# Altium footprint library IC.PcbLib: 108 footprints (part 2 of 8)
Each footprint in its own frame and in the unit in brackets; x right, y up, seen from the top. Pads: shape width x height; smd on the part's side, far side on the other; paste and mask are expansions set on the pad; w line width, h text height; cw(c..) or ccw(c..) is an arc to the next point about the centre after c.
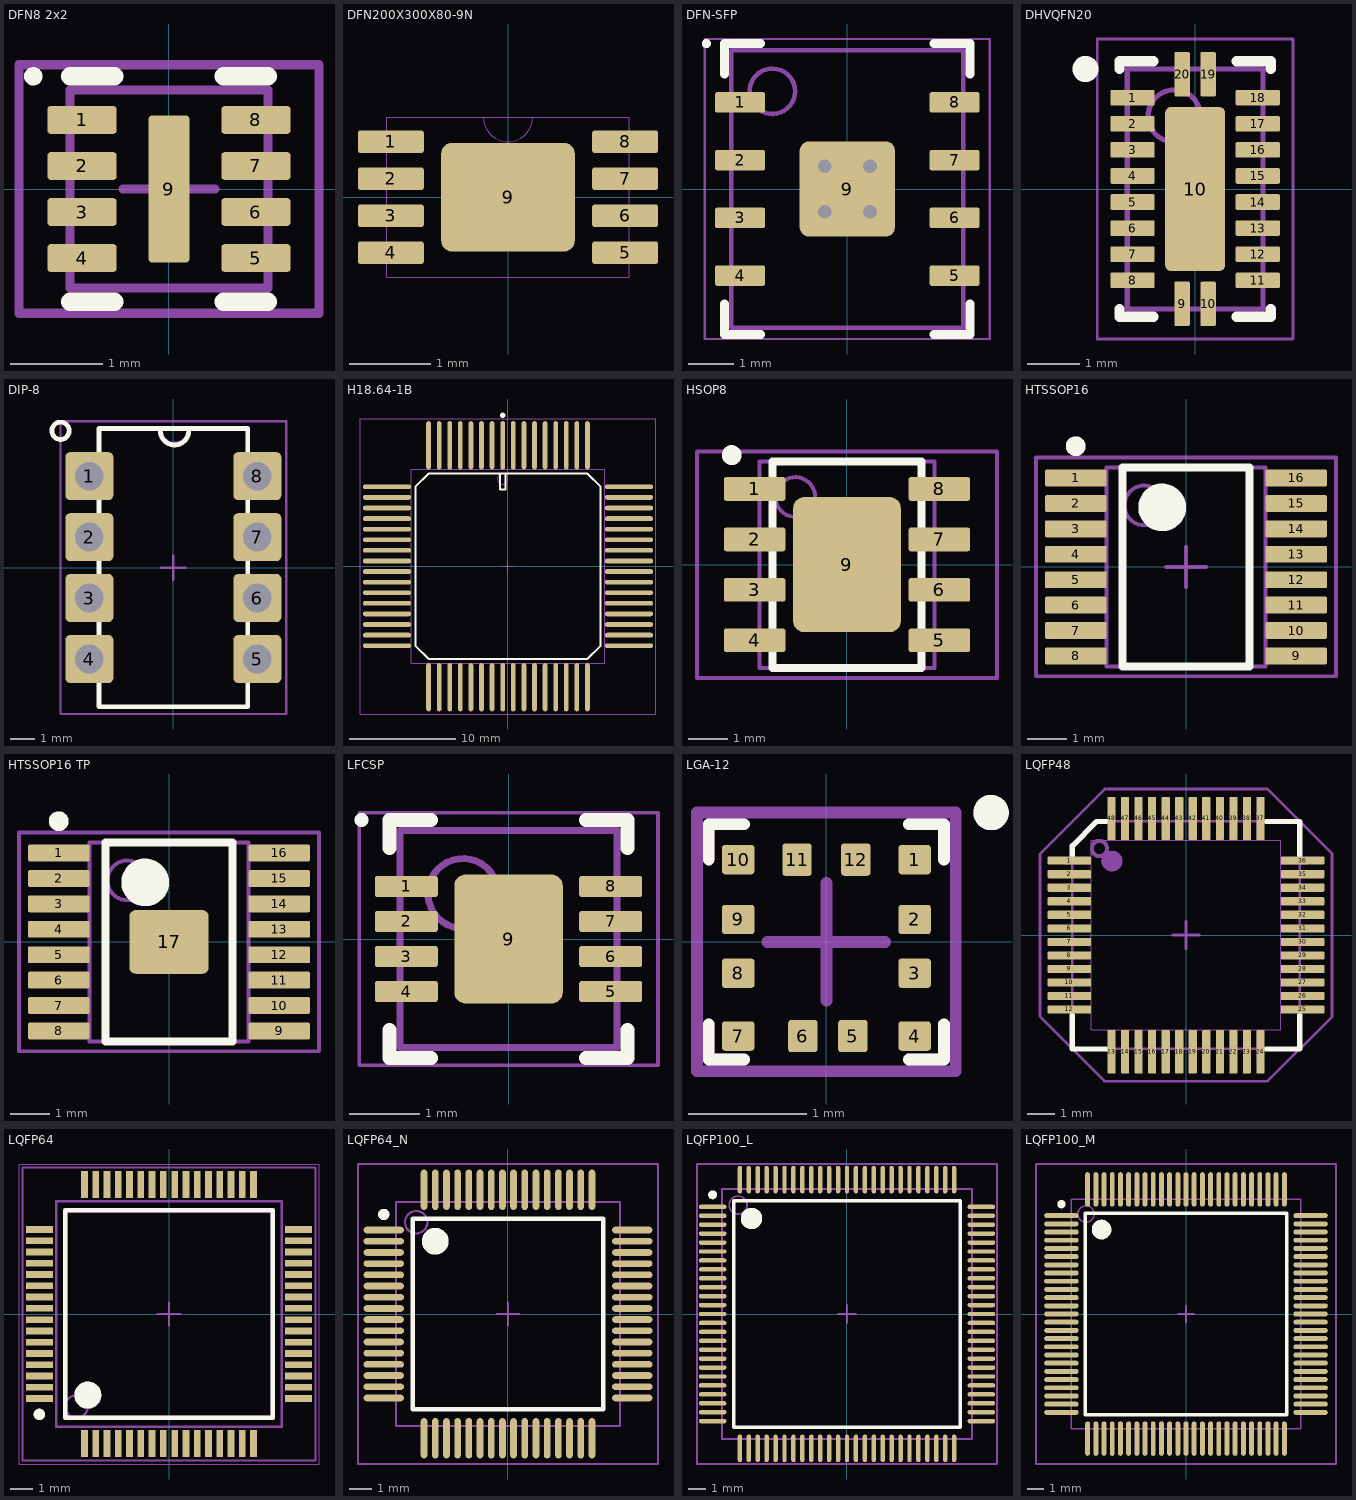
[diagram p1: the footprints below, top view; thin cyan lines are the x and y axes]

## DFN8 2x2 [mm] "LM193QT, SON, 8-Leads, Body 2,00x2,00mm, Pitch 0,50mm, Thermal Pad 1,58x0,59mm, IPC Medium Density"
height 0.6
pads (9):
  rrect20% 0.75x0.3 smd: 1(-0.945,0.75) 2(-0.945,0.25) 3(-0.945,-0.25) 4(-0.945,-0.75) 5(0.945,-0.75) 6(0.945,-0.25) 7(0.945,0.25) 8(0.945,0.75)
  rrect20% 0.45x1.6 smd paste-0.295: 9(0,0)
Top Overlay:
  circle w0.1: c-1.475,1.225 r0.05
  lines w0.2: -1.075,-1.225 -0.595,-1.225 ; -1.075,1.225 -0.595,1.225 ; 0.595,-1.225 1.075,-1.225 ; 0.595,1.225 1.075,1.225
Top Paste:
  rectangle: 0.1,-1.4 1.4,-0.1
  rectangle: 0.1,0.1 1.4,1.4
  rectangle: -1.4,-1.4 -0.1,-0.1
  rectangle: -1.4,0.1 -0.1,1.4
M3_comm_top:
  text ".comment" at -1.35,-0.225 h1
M5_asm_top:
  lines w0.1: -1.075,-1.075 1.075,-1.075 1.075,1.075 -1.075,1.075 -1.075,-1.075
  text ".Designator" at -1.475,1.25 h1
M7_courtyard_top:
  lines w0.1: -0.5,0 0.5,0 ; 0,-0.5 0,0.5 ; -1.63,-1.35 1.63,-1.35 1.63,1.35 -1.63,1.35 -1.63,-1.35
3D body "DFN8 2x2.step": height 0.6, standoff 0, extent -1.125,-1.075 1.125,1.075

## DFN200X300X80-9N [mil]
pads (9):
  rrect20% 32x11 smd: 1(-57,27) 2(-57,9) 3(-57,-9) 4(-57,-27) 5(57,-27) 6(57,-9) 7(57,9) 8(57,27)
  rrect20% 65x53 smd: 9(0,0)
M1_3D_TOP:
  lines w0: -12,39 ccw(c0,39) 12,39 ; -12,39 12,39 ; -12,39 -59,39 -59,-39 59,-39 59,39 12,39
3D body "User Library-DFN-8-1.step": height 31.1, standoff -0.39, extent -61.02,-39.36 61.03,39.38

## DFN-SFP [mm] "DFN Small Flag Package"
height 0.9
pads (9):
  rrect20% 1.1x0.45 smd: 1(-2.36,1.905) 2(-2.36,0.635) 3(-2.36,-0.635) 4(-2.36,-1.905) 5(2.36,-1.905) 6(2.36,-0.635) 7(2.36,0.635) 8(2.36,1.905)
  rrect20% 2.1x2.1 smd: 9(0,0)
via -0.5,0.5 diameter 0.7 hole 0.3
via 0.5,0.5 diameter 0.7 hole 0.3
via -0.5,-0.5 diameter 0.7 hole 0.3
via 0.5,-0.5 diameter 0.7 hole 0.3
Top Overlay:
  circle w0.1: c-3.1,3.2 r0.05
  lines w0.2: -2.7,-2.53 -2.7,-3.2 -1.91,-3.2 ; -2.7,2.53 -2.7,3.2 -1.91,3.2 ; 1.91,-3.2 2.7,-3.2 2.7,-2.53 ; 1.91,3.2 2.7,3.2 2.7,2.53
Mechanical 13:
  circle w0.1: c-1.65,2.15 r0.5
  lines w0.1: -2.55,-3.05 -2.55,3.05 2.55,3.05 2.55,-3.05 -2.55,-3.05
Mechanical 15:
  lines w0.05: -3.135,-3.3 -3.135,3.3 3.135,3.3 3.135,-3.3 -3.135,-3.3
  lines w0.1: -0.5,0 0.5,0 ; 0,-0.5 0,0.5
3D body "DFN-SFP.step": height 0.9, standoff 0, extent -2.551,-3.05 2.551,3.05

## DHVQFN20 [mm] "SOT764-1, QFN, 20-Leads, Body 2.60x4.60mm, Pitch 0.50mm, Thermal Pad 1.15x3.15mm, IPC Medium Density"
height 1
pads (21):
  rrect20% 0.85x0.3 smd: 1(-1.2,1.75) 2(-1.2,1.25) 3(-1.2,0.75) 4(-1.2,0.25) 5(-1.2,-0.25) 6(-1.2,-0.75) 7(-1.2,-1.25) 8(-1.2,-1.75) 11(1.2,-1.75) 12(1.2,-1.25) 13(1.2,-0.75) 14(1.2,-0.25) 15(1.2,0.25) 16(1.2,0.75) 17(1.2,1.25) 18(1.2,1.75)
  rrect20% 0.3x0.85 smd: 9(-0.25,-2.2) 10(0.25,-2.2) 19(0.25,2.2) 20(-0.25,2.2)
  rrect20% 1.15x3.15 smd: 10(0,0)
Top Overlay:
  circle w0.25: c-2.1,2.3 r0.125
  lines w0.2: -1.45,-2.3 -1.45,-2.45 -0.8,-2.45 ; -1.45,2.3 -1.45,2.45 -0.8,2.45 ; 0.8,-2.45 1.45,-2.45 1.45,-2.3 ; 0.8,2.45 1.45,2.45 1.45,2.3
Mechanical 13:
  circle w0.1: c-0.4,1.4 r0.5
  lines w0.1: -1.3,-2.3 1.3,-2.3 1.3,2.3 -1.3,2.3 -1.3,-2.3
Mechanical 15:
  lines w0.05: -1.875,-2.875 1.875,-2.875 1.875,2.875 -1.875,2.875 -1.875,-2.875
  lines w0.1: -0.5,0 0.5,0 ; 0,-0.5 0,0.5
3D body "DHVQFN2.step": height 1, standoff 0, extent -1.31,-2.31 1.31,2.31

## DIP-8 [mm] "HCNR201-000E"
height 3.43
pads (8):
  rrect20% 2x2 hole 1.2: 1(-3.5,3.81) 2(-3.5,1.27) 3(-3.5,-1.27) 4(-3.5,-3.81) 5(3.5,-3.81) 6(3.5,-1.27) 7(3.5,1.27) 8(3.5,3.81)
Top Overlay:
  lines w0.2: -4.358,5.814 ccw(c-4.7,5.7) -4.35,5.787 ; -0.543,5.71 ccw(c0.05,5.7) 0.643,5.7 ; -3.1,-5.8 3.1,-5.8 3.1,5.8 -3.1,5.8 -3.1,-5.8
M3_comm_top:
  text ".comment" at 0,0 h1
M5_asm_top:
  circle w0.15: c-4.7,5.7 r0.361
  lines w0.1: -0.55,5.785 ccw(c0.05,5.8) 0.65,5.8 ; -3.1,-5.8 3.1,-5.8 3.1,5.8 -3.1,5.8 -3.1,-5.8
  text ".Designator" at -0.7,6.1 h1
M7_courtyard_top:
  lines w0.1: -0.5,0 0.5,0 ; 0,-0.5 0,0.5 ; -4.7,-6.1 4.7,-6.1 4.7,6.1 -4.7,6.1 -4.7,-6.1
3D body "CircuitWorks-DIP8.STEP": height 4.19, standoff -2.67, extent -3.9,-5.615 3.974,5.815

## H18.64-1B [mm] "CQFP, 64-Leads, Body 26,60x26,60mm, Pitch 1,00mm, IPC Medium Density"
height 3
pads (64):
  oval 0.45x4.55 smd: 1(-0.5,11.425) 2(-1.5,11.425) 3(-2.5,11.425) 4(-3.5,11.425) 5(-4.5,11.425) 6(-5.5,11.425) 7(-6.5,11.425) 8(-7.5,11.425) 25(-7.5,-11.425) 26(-6.5,-11.425) 27(-5.5,-11.425) 28(-4.5,-11.425) 29(-3.5,-11.425) 30(-2.5,-11.425) 31(-1.5,-11.425) 32(-0.5,-11.425) 33(0.5,-11.425) 34(1.5,-11.425) 35(2.5,-11.425) 36(3.5,-11.425) 37(4.5,-11.425) 38(5.5,-11.425) 39(6.5,-11.425) 40(7.5,-11.425) 57(7.5,11.425) 58(6.5,11.425) 59(5.5,11.425) 60(4.5,11.425) 61(3.5,11.425) 62(2.5,11.425) 63(1.5,11.425) 64(0.5,11.425)
  oval 4.55x0.45 smd: 9(-11.425,7.5) 10(-11.425,6.5) 11(-11.425,5.5) 12(-11.425,4.5) 13(-11.425,3.5) 14(-11.425,2.5) 15(-11.425,1.5) 16(-11.425,0.5) 17(-11.425,-0.5) 18(-11.425,-1.5) 19(-11.425,-2.5) 20(-11.425,-3.5) 21(-11.425,-4.5) 22(-11.425,-5.5) 23(-11.425,-6.5) 24(-11.425,-7.5) 41(11.425,-7.5) 42(11.425,-6.5) 43(11.425,-5.5) 44(11.425,-4.5) 45(11.425,-3.5) 46(11.425,-2.5) 47(11.425,-1.5) 48(11.425,-0.5) 49(11.425,0.5) 50(11.425,1.5) 51(11.425,2.5) 52(11.425,3.5) 53(11.425,4.5) 54(11.425,5.5) 55(11.425,6.5) 56(11.425,7.5)
Top Overlay:
  circle w0.25: c-0.5,14.25 r0.125
  lines w0.2: -0.75,8.75 -0.75,7.25 -0.25,7.25 -0.25,8.75 ; -8.75,-7.5 -8.75,7.5 -7.5,8.75 7.5,8.75 8.75,7.5 8.75,-7.5 7.5,-8.75 -7.5,-8.75 -8.75,-7.5
M3_comm_top:
  text ".comment" at -2.775,-2.125 h1.52
M5_asm_top:
  circle w0.1: c-0.5,8.25 r0.5
  lines w0.1: -9.15,-9.15 -9.15,9.15 9.15,9.15 9.15,-9.15 -9.15,-9.15
M7_courtyard_top:
  lines w0.05: -13.95,-13.95 -13.95,13.95 13.95,13.95 13.95,-13.95 -13.95,-13.95
  lines w0.1: -0.5,0 0.5,0 ; 0,-0.5 0,0.5
3D body: height 0.25, standoff 0, extent 19.325,0.075 19.325,0.075
3D body "Миландр. STEP-модель для корпуса Н18.64-1В.STEP": height 2.93, standoff 0.08, extent -12.725,-12.75 12.775,12.75

## HSOP8 [mm] "SOIC, 8-Leads, PowerPAD SOIC - 1.7 mm max height"
height 1.5
pads (9):
  rrect20% 1.55x0.6 smd: 1(-2.325,1.905) 2(-2.325,0.635) 3(-2.325,-0.635) 4(-2.325,-1.905) 5(2.325,-1.905) 6(2.325,-0.635) 7(2.325,0.635) 8(2.325,1.905)
  rrect20% 2.71x3.4 smd: 9(0,0)
Top Overlay:
  circle w0.25: c-2.9,2.755 r0.125
  lines w0.2: -1.875,-2.6 1.875,-2.6 1.875,2.6 -1.875,2.6 -1.875,-2.6
M3_comm_top:
  text ".comment" at -1.2,-0.4 h1
M5_asm_top:
  circle w0.1: c-1.3,1.7 r0.5
  lines w0.1: -2.2,-2.6 -2.2,2.6 2.2,2.6 2.2,-2.6 -2.2,-2.6
  text ".Designator" at -1.6,2.9 h1
M7_courtyard_top:
  lines w0.1: -0.5,0 0.5,0 ; 0,-0.5 0,0.5 ; -3.775,-2.85 -3.775,2.85 3.775,2.85 3.775,-2.85 -3.775,-2.85
3D body "User Library-HSOP-8-DDA.STEP": height 1.7, standoff 0, extent -3.014,-2.346 3.014,2.346

## HTSSOP16 [mm] "IC REG BUCK ADJ 3A 16HTSSOP"
height 1.75
pads (16):
  rrect20% 1.55x0.425 smd: 1(-2.775,2.24) 2(-2.775,1.6) 3(-2.775,0.96) 4(-2.775,0.32) 5(-2.775,-0.32) 6(-2.775,-0.96) 7(-2.775,-1.6) 8(-2.775,-2.24) 9(2.775,-2.24) 10(2.775,-1.6) 11(2.775,-0.96) 12(2.775,-0.32) 13(2.775,0.32) 14(2.775,0.96) 15(2.775,1.6) 16(2.775,2.24)
Top Overlay:
  circle w0.25: c-2.775,3.04 r0.125
  circle w0.6: c-0.6,1.5 r0.3
  lines w0.2: -1.6,-2.5 -1.6,2.5 1.6,2.5 1.6,-2.5 -1.6,-2.5
M3_comm_top:
  text ".comment" at 0,0 h1
M5_asm_top:
  circle w0.1: c-1.05,1.55 r0.5
  lines w0.1: -2,-2.5 -2,2.5 2,2.5 2,-2.5 -2,-2.5
  text ".Designator" at -1.5,2.9 h1
M7_courtyard_top:
  lines w0.1: -3.775,-2.75 -3.775,2.75 3.775,2.75 3.775,-2.75 -3.775,-2.75 ; -0.5,0 0.5,0 -0.5,0 ; 0,-0.5 0,0.5 0,-0.5
3D body "QSOP16.step": height 1.75, standoff 0.01, extent -3.097,-2.5 3.097,2.5

## HTSSOP16 TP [mm] "TPS40056PWPR , IC REG BUCK ADJ 3A 16HTSSOP"
height 1.75
pads (17):
  rrect20% 1.55x0.425 smd: 1(-2.775,2.24) 2(-2.775,1.6) 3(-2.775,0.96) 4(-2.775,0.32) 5(-2.775,-0.32) 6(-2.775,-0.96) 7(-2.775,-1.6) 8(-2.775,-2.24) 9(2.775,-2.24) 10(2.775,-1.6) 11(2.775,-0.96) 12(2.775,-0.32) 13(2.775,0.32) 14(2.775,0.96) 15(2.775,1.6) 16(2.775,2.24)
  rrect20% 2x1.6 smd: 17(0,0)
Top Overlay:
  circle w0.25: c-2.775,3.04 r0.125
  circle w0.6: c-0.6,1.5 r0.3
  lines w0.2: -1.6,-2.5 -1.6,2.5 1.6,2.5 1.6,-2.5 -1.6,-2.5
M3_comm_top:
  text ".comment" at 0,0 h1
M5_asm_top:
  circle w0.1: c-1.05,1.55 r0.5
  lines w0.1: -2,-2.5 -2,2.5 2,2.5 2,-2.5 -2,-2.5
  text ".Designator" at -1.5,2.9 h1
M7_courtyard_top:
  lines w0.1: -3.775,-2.75 -3.775,2.75 3.775,2.75 3.775,-2.75 -3.775,-2.75 ; -0.5,0 0.5,0 -0.5,0 ; 0,-0.5 0,0.5 0,-0.5
3D body "QSOP16.step": height 1.75, standoff 0.01, extent -3.097,-2.5 3.097,2.5

## LFCSP [mm] "LFCPS, IPC Medium Density"
height 0.8
pads (9):
  rrect20% 0.9x0.3 smd mask+0.05: 1(-1.46,0.75) 2(-1.46,0.25) 3(-1.46,-0.25) 4(-1.46,-0.75) 5(1.46,-0.75) 6(1.46,-0.25) 7(1.46,0.25) 8(1.46,0.75)
  rrect20% 1.55x1.84 smd mask+0.05: 9(0,0)
Top Overlay:
  circle w0.1: c-2.1,1.7 r0.05
  lines w0.2: -1.7,-1.3 -1.7,-1.7 -1.11,-1.7 ; -1.7,1.3 -1.7,1.7 -1.11,1.7 ; 1.11,-1.7 1.7,-1.7 1.7,-1.3 ; 1.11,1.7 1.7,1.7 1.7,1.3
Mechanical 13:
  circle w0.1: c-0.65,0.65 r0.5
  lines w0.1: -1.55,-1.55 -1.55,1.55 1.55,1.55 1.55,-1.55 -1.55,-1.55
Mechanical 15:
  lines w0.05: -2.135,-1.8 -2.135,1.8 2.135,1.8 2.135,-1.8 -2.135,-1.8
  lines w0.1: -0.5,0 0.5,0 ; 0,-0.5 0,0.5
3D body: height 0.8, standoff 0.05, extent -1.55,-1.55 1.55,1.55

## LGA-12 [mm] "SENSOR MR I2C/SPI 12LGA"
pads (12):
  rrect20% 0.275x0.25 smd: 1(0.75,0.7) 2(0.75,0.191) 3(0.75,-0.266) 4(0.75,-0.8) 7(-0.75,-0.8) 8(-0.75,-0.266) 9(-0.75,0.191) 10(-0.75,0.7)
  rrect20% 0.25x0.275 smd: 5(0.225,-0.8) 6(-0.2,-0.8) 11(-0.25,0.7) 12(0.25,0.7)
Top Overlay:
  circle w0.2: c1.4,1.1 r0.05
  lines w0.1: -1,-0.7 -1,-1 -0.7,-1 ; -1,0.7 -1,1 -0.7,1 ; 0.7,-1 1,-1 1,-0.7 ; 0.7,1 1,1 1,0.7
M3_comm_top:
  text ".comment" at -0.8,-0.5 h1
M5_asm_top:
  circle w0.2: c1.4,1.1 r0.05
  lines w0.1: -1,-0.7 -1,-1 -0.7,-1 ; -1,0.7 -1,1 -0.7,1 ; 0.7,-1 1,-1 1,-0.7 ; 0.7,1 1,1 1,0.7
  text ".Designator" at -1,1.5 h1
M7_courtyard_top:
  lines w0.1: -0.5,0 0.5,0 ; 0,-0.5 0,0.5 ; -1.1,-1.1 1.1,-1.1 1.1,1.1 -1.1,1.1 -1.1,-1.1
3D body "User Library-LGA12_LIS2DS12.STEP": height 0.96, standoff 0, extent -1,-1.037 1,0.963

## LQFP48 [mm] "LQFP48, DP83848"
pads (48):
  rrect20% 1.6x0.3 smd: 1(-4.312,2.75) 2(-4.312,2.25) 3(-4.312,1.75) 4(-4.312,1.25) 5(-4.312,0.75) 6(-4.312,0.25) 7(-4.312,-0.25) 8(-4.312,-0.75) 9(-4.312,-1.25) 10(-4.312,-1.75) 11(-4.312,-2.25) 12(-4.312,-2.75) 25(4.312,-2.75) 26(4.312,-2.25) 27(4.312,-1.75) 28(4.312,-1.25) 29(4.312,-0.75) 30(4.312,-0.25) 31(4.312,0.25) 32(4.312,0.75) 33(4.312,1.25) 34(4.312,1.75) 35(4.312,2.25) 36(4.312,2.75)
  rrect20% 0.3x1.6 smd: 13(-2.75,-4.312) 14(-2.25,-4.312) 15(-1.75,-4.312) 16(-1.25,-4.312) 17(-0.75,-4.312) 18(-0.25,-4.312) 19(0.25,-4.312) 20(0.75,-4.312) 21(1.25,-4.312) 22(1.75,-4.312) 23(2.25,-4.312) 24(2.75,-4.312) 37(2.75,4.312) 38(2.25,4.312) 39(1.75,4.312) 40(1.25,4.312) 41(0.75,4.312) 42(0.25,4.312) 43(-0.25,4.312) 44(-0.75,4.312) 45(-1.25,4.312) 46(-1.75,4.312) 47(-2.25,4.312) 48(-2.75,4.312)
Top Overlay:
  lines w0.152: -4.2,-4.21 -4.2,-3.96
  lines w0.2: -4.2,-2.96 -4.2,-4.21 -2.95,-4.21 ; -4.2,2.95 -4.2,3.3 -3.3,4.2 -2.95,4.2 ; 2.96,-4.21 4.21,-4.21 4.21,-2.96 ; 2.96,4.2 4.21,4.2 4.21,2.95
M3_comm_top:
  text ".comment" at 0,0 h1
M5_asm_top:
  circle w0.152: c-3.2,3.2 r0.283
  lines w0.1: -4.205,-4.205 -4.205,3.295 -3.295,4.205 4.205,4.205 4.2,4.2 4.2,-4.22 4.185,-4.205 -4.205,-4.205
  text ".Designator" at -1.1,4.7 h1
M7_courtyard_top:
  lines w0.1: -0.5,0 0.5,0 ; 0,-0.5 0,0.5 ; -5.4,-3.01 -5.4,3 -3,5.4 3.01,5.4 5.4,3.01 5.4,-3.02 3.02,-5.4 -3.01,-5.4 -5.4,-3.01
Mechanical 16:
  drawing of 197 lines, arcs and shapes, not listed
3D body "User Library-LQFP50P700X700x160-48N.step": height 1.6, standoff 0.01, extent -4.49,-4.49 4.49,4.49

## LQFP64 [mm] "64-pin, 10x10mm low-profile quad flat package"
height 1.6
pads (64):
  rect 1.2x0.3 smd: 1(-5.75,-3.75) 2(-5.75,-3.25) 3(-5.75,-2.75) 4(-5.75,-2.25) 5(-5.75,-1.75) 6(-5.75,-1.25) 7(-5.75,-0.75) 8(-5.75,-0.25) 9(-5.75,0.25) 10(-5.75,0.75) 11(-5.75,1.25) 12(-5.75,1.75) 13(-5.75,2.25) 14(-5.75,2.75) 15(-5.75,3.25) 16(-5.75,3.75) 33(5.75,3.75) 34(5.75,3.25) 35(5.75,2.75) 36(5.75,2.25) 37(5.75,1.75) 38(5.75,1.25) 39(5.75,0.75) 40(5.75,0.25) 41(5.75,-0.25) 42(5.75,-0.75) 43(5.75,-1.25) 44(5.75,-1.75) 45(5.75,-2.25) 46(5.75,-2.75) 47(5.75,-3.25) 48(5.75,-3.75)
  rect 0.3x1.2 smd: 17(-3.75,5.75) 18(-3.25,5.75) 19(-2.75,5.75) 20(-2.25,5.75) 21(-1.75,5.75) 22(-1.25,5.75) 23(-0.75,5.75) 24(-0.25,5.75) 25(0.25,5.75) 26(0.75,5.75) 27(1.25,5.75) 28(1.75,5.75) 29(2.25,5.75) 30(2.75,5.75) 31(3.25,5.75) 32(3.75,5.75) 49(3.75,-5.75) 50(3.25,-5.75) 51(2.75,-5.75) 52(2.25,-5.75) 53(1.75,-5.75) 54(1.25,-5.75) 55(0.75,-5.75) 56(0.25,-5.75) 57(-0.25,-5.75) 58(-0.75,-5.75) 59(-1.25,-5.75) 60(-1.75,-5.75) 61(-2.25,-5.75) 62(-2.75,-5.75) 63(-3.25,-5.75) 64(-3.75,-5.75)
Top Overlay:
  circle w0.6: c-3.6,-3.6 r0.3
  circle w0.25: c-5.75,-4.45 r0.125
  lines w0.2: -4.6,-4.6 4.6,-4.6 4.6,4.6 -4.6,4.6 -4.6,-4.6
M3_comm_top:
  text ".comment" at -3,-0.5 h2
M5_asm_top:
  circle w0.25: c-5.75,-4.45 r0.125
  circle w0.6: c-3.6,-3.6 r0.3
  lines w0.2: -4.6,-4.6 -4.6,4.6 4.6,4.6 4.6,-4.6 -4.6,-4.6
  text ".Designator" at -2.8,3 h2
M7_courtyard_top:
  lines w0.1: -0.5,0 0.5,0 ; 0,-0.5 0,0.5 ; -6.5,-6.5 -6.5,6.5 6.5,6.5 6.5,-6.5 -6.5,-6.5
Mechanical 13:
  circle w0.1: c-4.1,-4.1 r0.5
  lines w0.1: -5,-5 5,-5 5,5 -5,5 -5,-5
Mechanical 15:
  lines w0.05: -6.65,-6.65 6.65,-6.65 6.65,6.65 -6.65,6.65 -6.65,-6.65
  lines w0.1: -0.5,0 0.5,0 ; 0,-0.5 0,0.5
3D body "LQFP64.step": height 1.6, standoff 0, extent -6,-6 6,6

## LQFP64_N [mm] "Thin QFP, 64-Leads, Body 10x10mm, Pitch 0.5mm, IPC Medium Density"
height 1.6
pads (64):
  oval 1.8x0.3 smd: 1(-5.55,3.75) 2(-5.55,3.25) 3(-5.55,2.75) 4(-5.55,2.25) 5(-5.55,1.75) 6(-5.55,1.25) 7(-5.55,0.75) 8(-5.55,0.25) 9(-5.55,-0.25) 10(-5.55,-0.75) 11(-5.55,-1.25) 12(-5.55,-1.75) 13(-5.55,-2.25) 14(-5.55,-2.75) 15(-5.55,-3.25) 16(-5.55,-3.75) 33(5.55,-3.75) 34(5.55,-3.25) 35(5.55,-2.75) 36(5.55,-2.25) 37(5.55,-1.75) 38(5.55,-1.25) 39(5.55,-0.75) 40(5.55,-0.25) 41(5.55,0.25) 42(5.55,0.75) 43(5.55,1.25) 44(5.55,1.75) 45(5.55,2.25) 46(5.55,2.75) 47(5.55,3.25) 48(5.55,3.75)
  oval 0.3x1.8 smd: 17(-3.75,-5.55) 18(-3.25,-5.55) 19(-2.75,-5.55) 20(-2.25,-5.55) 21(-1.75,-5.55) 22(-1.25,-5.55) 23(-0.75,-5.55) 24(-0.25,-5.55) 25(0.25,-5.55) 26(0.75,-5.55) 27(1.25,-5.55) 28(1.75,-5.55) 29(2.25,-5.55) 30(2.75,-5.55) 31(3.25,-5.55) 32(3.75,-5.55) 49(3.75,5.55) 50(3.25,5.55) 51(2.75,5.55) 52(2.25,5.55) 53(1.75,5.55) 54(1.25,5.55) 55(0.75,5.55) 56(0.25,5.55) 57(-0.25,5.55) 58(-0.75,5.55) 59(-1.25,5.55) 60(-1.75,5.55) 61(-2.25,5.55) 62(-2.75,5.55) 63(-3.25,5.55) 64(-3.75,5.55)
Top Overlay:
  circle w0.6: c-3.25,3.25 r0.3
  circle w0.25: c-5.55,4.45 r0.125
  lines w0.2: -4.25,-4.25 4.25,-4.25 4.25,4.25 -4.25,4.25 -4.25,-4.25
Mechanical 13:
  circle w0.1: c-4.1,4.1 r0.5
  lines w0.1: -5,-5 5,-5 5,5 -5,5 -5,-5
Mechanical 15:
  lines w0.1: -0.5,0 0.5,0 ; 0,-0.5 0,0.5 ; -6.7,-6.7 6.7,-6.7 6.7,6.7 -6.7,6.7 -6.7,-6.7
3D body: height 1.6, standoff 0, extent -5,-5 5,5

## LQFP100_L [mm] "Thin QFP, 100-Leads, Body 14x14mm, Pitch 0.5mm, IPC High Density"
height 1.6
pads (100):
  oval 1.55x0.25 smd: 1(-7.525,6) 2(-7.525,5.5) 3(-7.525,5) 4(-7.525,4.5) 5(-7.525,4) 6(-7.525,3.5) 7(-7.525,3) 8(-7.525,2.5) 9(-7.525,2) 10(-7.525,1.5) 11(-7.525,1) 12(-7.525,0.5) 13(-7.525,0) 14(-7.525,-0.5) 15(-7.525,-1) 16(-7.525,-1.5) 17(-7.525,-2) 18(-7.525,-2.5) 19(-7.525,-3) 20(-7.525,-3.5) 21(-7.525,-4) 22(-7.525,-4.5) 23(-7.525,-5) 24(-7.525,-5.5) 25(-7.525,-6) 51(7.525,-6) 52(7.525,-5.5) 53(7.525,-5) 54(7.525,-4.5) 55(7.525,-4) 56(7.525,-3.5) 57(7.525,-3) 58(7.525,-2.5) 59(7.525,-2) 60(7.525,-1.5) 61(7.525,-1) 62(7.525,-0.5) 63(7.525,0) 64(7.525,0.5) 65(7.525,1) 66(7.525,1.5) 67(7.525,2) 68(7.525,2.5) 69(7.525,3) 70(7.525,3.5) 71(7.525,4) 72(7.525,4.5) 73(7.525,5) 74(7.525,5.5) 75(7.525,6)
  oval 0.25x1.55 smd: 26(-6,-7.525) 27(-5.5,-7.525) 28(-5,-7.525) 29(-4.5,-7.525) 30(-4,-7.525) 31(-3.5,-7.525) 32(-3,-7.525) 33(-2.5,-7.525) 34(-2,-7.525) 35(-1.5,-7.525) 36(-1,-7.525) 37(-0.5,-7.525) 38(0,-7.525) 39(0.5,-7.525) 40(1,-7.525) 41(1.5,-7.525) 42(2,-7.525) 43(2.5,-7.525) 44(3,-7.525) 45(3.5,-7.525) 46(4,-7.525) 47(4.5,-7.525) 48(5,-7.525) 49(5.5,-7.525) 50(6,-7.525) 76(6,7.525) 77(5.5,7.525) 78(5,7.525) 79(4.5,7.525) 80(4,7.525) 81(3.5,7.525) 82(3,7.525) 83(2.5,7.525) 84(2,7.525) 85(1.5,7.525) 86(1,7.525) 87(0.5,7.525) 88(0,7.525) 89(-0.5,7.525) 90(-1,7.525) 91(-1.5,7.525) 92(-2,7.525) 93(-2.5,7.525) 94(-3,7.525) 95(-3.5,7.525) 96(-4,7.525) 97(-4.5,7.525) 98(-5,7.525) 99(-5.5,7.525) 100(-6,7.525)
Top Overlay:
  circle w0.6: c-5.35,5.35 r0.3
  circle w0.25: c-7.525,6.675 r0.125
  lines w0.2: -6.35,-6.35 6.35,-6.35 6.35,6.35 -6.35,6.35 -6.35,-6.35
Mechanical 13:
  circle w0.1: c-6.1,6.1 r0.5
  lines w0.1: -7,-7 7,-7 7,7 -7,7 -7,-7
Mechanical 15:
  lines w0.1: -0.5,0 0.5,0 ; 0,-0.5 0,0.5 ; -8.4,-8.4 8.4,-8.4 8.4,8.4 -8.4,8.4 -8.4,-8.4
3D body: height 1.6, standoff 0, extent -7,-7 7,7

## LQFP100_M [mm] "Thin QFP, 100-Leads, Body 14x14mm, Pitch 0.5mm, IPC Low Density"
height 1.6
pads (100):
  oval 2.1x0.3 smd: 1(-7.6,6) 2(-7.6,5.5) 3(-7.6,5) 4(-7.6,4.5) 5(-7.6,4) 6(-7.6,3.5) 7(-7.6,3) 8(-7.6,2.5) 9(-7.6,2) 10(-7.6,1.5) 11(-7.6,1) 12(-7.6,0.5) 13(-7.6,0) 14(-7.6,-0.5) 15(-7.6,-1) 16(-7.6,-1.5) 17(-7.6,-2) 18(-7.6,-2.5) 19(-7.6,-3) 20(-7.6,-3.5) 21(-7.6,-4) 22(-7.6,-4.5) 23(-7.6,-5) 24(-7.6,-5.5) 25(-7.6,-6) 51(7.6,-6) 52(7.6,-5.5) 53(7.6,-5) 54(7.6,-4.5) 55(7.6,-4) 56(7.6,-3.5) 57(7.6,-3) 58(7.6,-2.5) 59(7.6,-2) 60(7.6,-1.5) 61(7.6,-1) 62(7.6,-0.5) 63(7.6,0) 64(7.6,0.5) 65(7.6,1) 66(7.6,1.5) 67(7.6,2) 68(7.6,2.5) 69(7.6,3) 70(7.6,3.5) 71(7.6,4) 72(7.6,4.5) 73(7.6,5) 74(7.6,5.5) 75(7.6,6)
  oval 0.3x2.1 smd: 26(-6,-7.6) 27(-5.5,-7.6) 28(-5,-7.6) 29(-4.5,-7.6) 30(-4,-7.6) 31(-3.5,-7.6) 32(-3,-7.6) 33(-2.5,-7.6) 34(-2,-7.6) 35(-1.5,-7.6) 36(-1,-7.6) 37(-0.5,-7.6) 38(0,-7.6) 39(0.5,-7.6) 40(1,-7.6) 41(1.5,-7.6) 42(2,-7.6) 43(2.5,-7.6) 44(3,-7.6) 45(3.5,-7.6) 46(4,-7.6) 47(4.5,-7.6) 48(5,-7.6) 49(5.5,-7.6) 50(6,-7.6) 76(6,7.6) 77(5.5,7.6) 78(5,7.6) 79(4.5,7.6) 80(4,7.6) 81(3.5,7.6) 82(3,7.6) 83(2.5,7.6) 84(2,7.6) 85(1.5,7.6) 86(1,7.6) 87(0.5,7.6) 88(0,7.6) 89(-0.5,7.6) 90(-1,7.6) 91(-1.5,7.6) 92(-2,7.6) 93(-2.5,7.6) 94(-3,7.6) 95(-3.5,7.6) 96(-4,7.6) 97(-4.5,7.6) 98(-5,7.6) 99(-5.5,7.6) 100(-6,7.6)
Top Overlay:
  circle w0.6: c-5.15,5.15 r0.3
  circle w0.25: c-7.6,6.7 r0.125
  lines w0.2: -6.15,-6.15 6.15,-6.15 6.15,6.15 -6.15,6.15 -6.15,-6.15
Mechanical 13:
  circle w0.1: c-6.1,6.1 r0.5
  lines w0.1: -7,-7 7,-7 7,7 -7,7 -7,-7
Mechanical 15:
  lines w0.1: -0.5,0 0.5,0 ; 0,-0.5 0,0.5 ; -9.15,-9.15 9.15,-9.15 9.15,9.15 -9.15,9.15 -9.15,-9.15
3D body: height 1.6, standoff 0, extent -7,-7 7,7